# Altium footprint library PcbLib1.PcbLib: 58 footprints (part 1 of 4)
Each footprint in its own frame and in the unit in brackets; x right, y up, seen from the top. Pads: shape width x height; smd on the part's side, far side on the other; paste and mask are expansions set on the pad; w line width, h text height; cw(c..) or ccw(c..) is an arc to the next point about the centre after c.
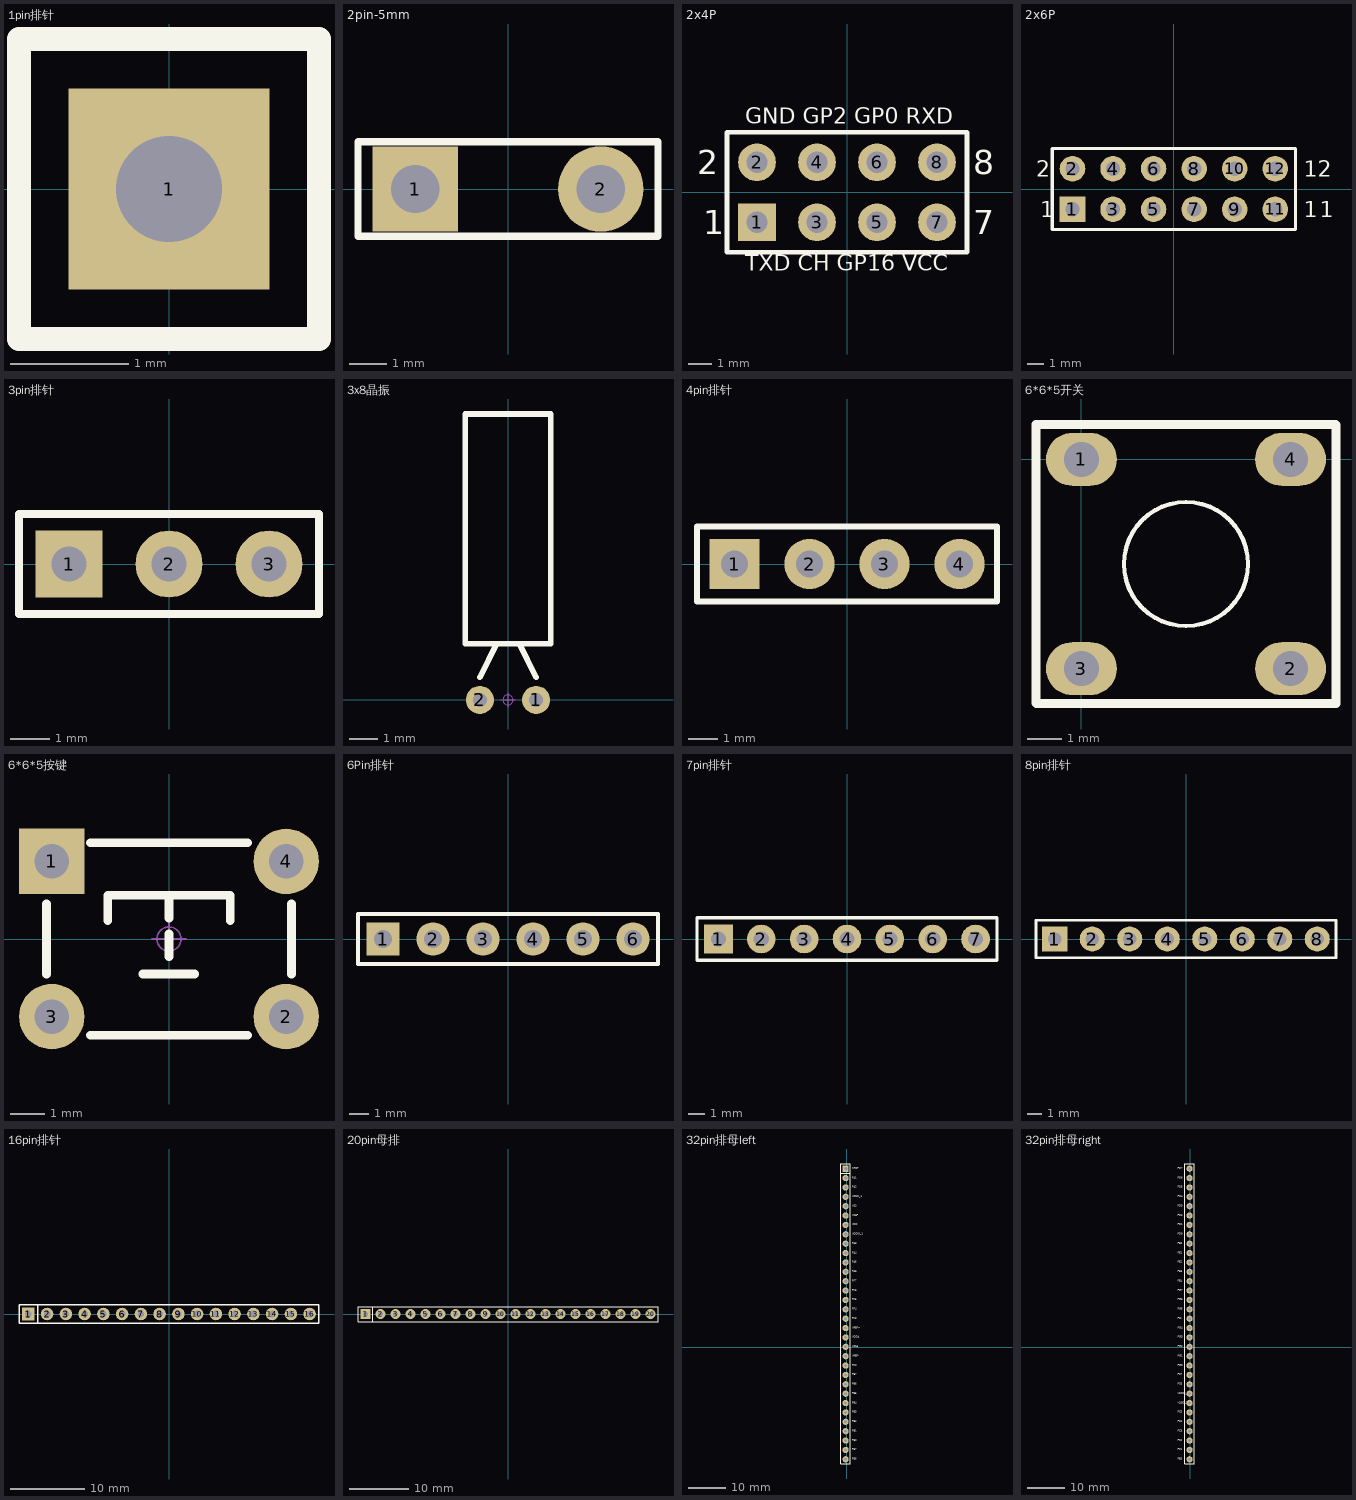
[diagram p0: the footprints below, top view; thin cyan lines are the x and y axes]

## 1pin排针 [mm] "排母，1脚"
pads (1):
  rect 1.7x1.7 hole 0.9: 1(0,0)
Top Overlay:
  lines w0.2: -1.27,-1.27 1.27,-1.27 1.27,1.27 -1.27,1.27 -1.27,-1.27
3D body: height 8.5, standoff -3, extent -1.27,-1.27 1.27,1.27

## 2pin-5mm [mm] "排母，2脚"
pads (2):
  rect 2.3x2.3 hole 1.3: 1(-2.5,0)
  round 2.3 hole 1.3: 2(2.5,0)
Top Overlay:
  lines w0.2: -4.04,-1.27 -4.04,1.27 4.04,1.27 4.04,-1.27 -4.04,-1.27
3D body: height 8.5, standoff -3, extent -3.765,-1.245 -1.225,1.295
3D body: height 8.5, standoff -3, extent 1.225,-1.27 3.765,1.27

## 2x4P [mm] "双排排针，4x2脚"
pads (8):
  rect 1.6x1.6 hole 0.9: 1(-3.81,-1.27)
  round 1.6 hole 0.9: 2(-3.81,1.27) 3(-1.27,-1.27) 4(-1.27,1.27) 5(1.27,-1.27) 6(1.27,1.27) 7(3.81,-1.27) 8(3.81,1.27)
Top Overlay:
  lines w0.2: -2.328,-2.54 5.08,-2.54 5.08,2.54 -5.08,2.54 -5.08,-2.54 2.54,-2.54
  text "7" at 5.334,-1.778 h1.02
  text "2" at -6.35,0.762 h1.02
  text "1" at -6.096,-1.778 h1.02
  text "8" at 5.334,0.762 h1.02
  text "TXD CH GP16 VCC" at -4.318,-3.556 h1.17
  text "GND GP2 GP0 RXD" at -4.318,2.667 h1.17
3D body: height 8.5, standoff -3, extent 0,-2.54 2.54,2.54
3D body: height 8.5, standoff -3, extent 2.54,-2.54 5.08,2.54
3D body: height 8.5, standoff -3, extent -5.08,-2.54 -2.54,2.54
3D body: height 8.5, standoff -3, extent -2.54,-2.54 0,2.54

## 2x6P [mm] "双排排针，6x2脚"
pads (12):
  rect 1.6x1.6 hole 0.9: 1(-6.35,-1.27)
  round 1.6 hole 0.9: 2(-6.35,1.27) 3(-3.81,-1.27) 4(-3.81,1.27) 5(-1.27,-1.27) 6(-1.27,1.27) 7(1.27,-1.27) 8(1.27,1.27) 9(3.81,-1.27) 10(3.81,1.27) 11(6.35,-1.27) 12(6.35,1.27)
Top Overlay:
  lines w0.2: -7.62,-2.54 -7.62,2.54 7.62,2.54 7.62,-2.54 -7.62,-2.54
  text "2" at -8.636,0.762 h1.02
  text "1" at -8.382,-1.778 h1.02
  text "1" at 8.128,-1.778 h1.02
  text "1" at 9.144,-1.778 h1.02
  text "12" at 8.128,0.762 h1.02
3D body: height 8.5, standoff -3, extent 5.08,-2.54 7.62,2.54
3D body: height 8.5, standoff -3, extent -2.54,-2.54 0,2.54
3D body: height 8.5, standoff -3, extent 0,-2.54 2.54,2.54
3D body: height 8.5, standoff -3, extent -7.62,-2.54 -5.08,2.54
3D body: height 8.5, standoff -3, extent -5.08,-2.54 -2.54,2.54
3D body: height 8.5, standoff -3, extent 2.54,-2.54 5.08,2.54

## 3pin排针 [mm] "排针，3脚"
pads (3):
  rect 1.7x1.7 hole 0.9: 1(-2.54,0)
  round 1.7 hole 0.9: 2(0,0) 3(2.54,0)
Top Overlay:
  lines w0.2: -3.81,-1.27 -3.81,1.27 3.81,1.27 3.81,-1.27 -3.81,-1.27
3D body: height 8.5, standoff -3, extent 1.27,-1.27 3.81,1.27
3D body: height 8.5, standoff -3, extent -1.27,-1.27 1.27,1.27
3D body: height 8.5, standoff -3, extent -3.81,-1.27 -1.27,1.27

## 3x8晶振 [mm] "脚距：2mm"
pads (2):
  round 1 hole 0.5: 1(1,0) 2(-1,0)
Top Overlay:
  lines w0.2: -1,0.8 -0.4,2 ; 0.4,2 1,0.8 ; -1.524,2 1.524,2 1.524,10.16 -1.524,10.16 -1.524,2
Mechanical 15:
  circle w0.04: c0,0 r0.18
  lines w0.04: -0.254,0 0.254,0 ; 0,-0.254 0,0.254
3D body: height 3.03, standoff -2.6, extent -1.5,-0.179 1.5,10

## 4pin排针 [mm] "排母，4脚"
pads (4):
  rect 1.7x1.7 hole 0.9: 1(-3.81,0)
  round 1.7 hole 0.9: 2(-1.27,0) 3(1.27,0) 4(3.81,0)
Top Overlay:
  lines w0.2: -5.08,-1.27 -5.08,1.27 5.08,1.27 5.08,-1.27 -5.08,-1.27
3D body: height 8.5, standoff -3, extent -2.54,-1.27 0,1.27
3D body: height 8.5, standoff -3, extent -5.08,-1.27 -2.54,1.27
3D body: height 8.5, standoff -3, extent 2.54,-1.27 5.08,1.27
3D body: height 8.5, standoff -3, extent 0,-1.27 2.54,1.27

## 6*6*5开关 [mm] "单位mm"
pads (4):
  oval 2.032x1.524 hole 1: 1(0,0) 2(6,-6) 3(0,-6) 4(6,0)
Top Overlay:
  circle w0.127: c3,-3 r1.778
  lines w0.254: -1.3,-6.985 -1.285,-7 7.3,-7 7.3,0.985 7.285,1 -1.3,1 -1.3,-6.985

## 6*6*5按键 [mm] "6*6*5mm"
pads (4):
  rect 1.9x1.9 hole 1: 1(-3.4,2.25)
  round 1.9 hole 1: 2(3.4,-2.25) 3(-3.4,-2.25) 4(3.4,2.25)
Top Overlay:
  lines w0.254: -3.556,-1.016 -3.556,1.016 ; -2.286,-2.794 2.286,-2.794 ; -2.286,2.794 2.286,2.794 ; -1.778,0.533 -1.778,1.27 1.778,1.27 1.778,0.533 ; -0.762,-1.016 0.737,-1.016 ; 0,-0.508 0,0.152 ; 0,0.61 0,1.27 ; 3.556,-1.016 3.556,1.016
Mechanical 15:
  circle w0.05: c0,0 r0.35
  lines w0.05: -0.5,0 0.5,0 ; 0,-0.5 0,0.5
3D body: height 4.95, standoff -3.45, extent -4.106,-3 4.106,3

## 6Pin排针 [mm] "排母，6脚"
pads (6):
  rect 1.7x1.7 hole 0.9: 1(-6.35,0)
  round 1.7 hole 0.9: 2(-3.81,0) 3(-1.27,0) 4(1.27,0) 5(3.81,0) 6(6.35,0)
Top Overlay:
  lines w0.2: -7.62,-1.27 7.62,-1.27 7.62,1.27 -7.62,1.27 -7.62,-1.27
3D body: height 8.5, standoff -3, extent -2.54,-1.27 0,1.27
3D body: height 8.5, standoff -3, extent -7.62,-1.27 -5.08,1.27
3D body: height 8.5, standoff -3, extent -5.08,-1.27 -2.54,1.27
3D body: height 8.5, standoff -3, extent 5.08,-1.27 7.62,1.27
3D body: height 8.5, standoff -3, extent 0,-1.27 2.54,1.27
3D body: height 8.5, standoff -3, extent 2.54,-1.27 5.08,1.27

## 7pin排针 [mm] "排针，7脚"
pads (7):
  rect 1.7x1.7 hole 0.9: 1(-7.62,0)
  round 1.7 hole 0.9: 2(-5.08,0) 3(-2.54,0) 4(0,0) 5(2.54,0) 6(5.08,0) 7(7.62,0)
Top Overlay:
  lines w0.2: -8.89,-1.27 -8.89,1.27 8.89,1.27 8.89,-1.27 -8.89,-1.27
3D body: height 8.5, standoff -3, extent -8.89,-1.27 -6.35,1.27
3D body: height 8.5, standoff -3, extent -6.35,-1.27 -3.81,1.27
3D body: height 8.5, standoff -3, extent -3.81,-1.27 -1.27,1.27
3D body: height 8.5, standoff -3, extent -1.27,-1.27 1.27,1.27
3D body: height 8.5, standoff -3, extent 1.27,-1.27 3.81,1.27
3D body: height 8.5, standoff -3, extent 3.81,-1.27 6.35,1.27
3D body: height 8.5, standoff -3, extent 6.35,-1.27 8.89,1.27

## 8pin排针 [mm] "排针，8脚"
pads (8):
  rect 1.7x1.7 hole 0.9: 1(-8.89,0)
  round 1.7 hole 0.9: 2(-6.35,0) 3(-3.81,0) 4(-1.27,0) 5(1.27,0) 6(3.81,0) 7(6.35,0) 8(8.89,0)
Top Overlay:
  lines w0.2: -10.16,-1.27 10.16,-1.27 10.16,1.27 -10.16,1.27 -10.16,-1.27
3D body: height 8.5, standoff -3, extent -10.16,-1.27 -7.62,1.27
3D body: height 8.5, standoff -3, extent -7.62,-1.27 -5.08,1.27
3D body: height 8.5, standoff -3, extent -5.08,-1.27 -2.54,1.27
3D body: height 8.5, standoff -3, extent -2.54,-1.27 0,1.27
3D body: height 8.5, standoff -3, extent 0,-1.27 2.54,1.27
3D body: height 8.5, standoff -3, extent 5.08,-1.27 7.62,1.27
3D body: height 8.5, standoff -3, extent 2.54,-1.27 5.08,1.27
3D body: height 8.5, standoff -3, extent 7.62,-1.27 10.16,1.27

## 16pin排针 [mm] "排母，16脚"
pads (16):
  rect 1.7x1.7 hole 0.9: 1(-19.05,0)
  round 1.7 hole 0.9: 2(-16.51,0) 3(-13.97,0) 4(-11.43,0) 5(-8.89,0) 6(-6.35,0) 7(-3.81,0) 8(-1.27,0) 9(1.27,0) 10(3.81,0) 11(6.35,0) 12(8.89,0) 13(11.43,0) 14(13.97,0) 15(16.51,0) 16(19.05,0)
Top Overlay:
  lines w0.2: -17.8,-1.25 -17.8,1.25 ; -20.32,-1.27 20.32,-1.27 20.32,1.27 -18.415,1.27 -20.32,1.27 -20.32,-1.27
3D body: height 8.5, standoff -3, extent 17.78,-1.27 20.32,1.27
3D body: height 8.5, standoff -3, extent 15.24,-1.27 17.78,1.27
3D body: height 8.5, standoff -3, extent 12.7,-1.27 15.24,1.27
3D body: height 8.5, standoff -3, extent 10.16,-1.27 12.7,1.27
3D body: height 8.5, standoff -3, extent 7.62,-1.27 10.16,1.27
3D body: height 8.5, standoff -3, extent 0,-1.27 2.54,1.27
3D body: height 8.5, standoff -3, extent -2.54,-1.27 0,1.27
3D body: height 8.5, standoff -3, extent -5.08,-1.27 -2.54,1.27
3D body: height 8.5, standoff -3, extent -7.62,-1.27 -5.08,1.27
3D body: height 8.5, standoff -3, extent -10.16,-1.27 -7.62,1.27
3D body: height 8.5, standoff -3, extent -12.7,-1.27 -10.16,1.27
3D body: height 8.5, standoff -3, extent -15.24,-1.27 -12.7,1.27
3D body: height 8.5, standoff -3, extent -17.78,-1.27 -15.24,1.27
3D body: height 8.5, standoff -3, extent -20.32,-1.27 -17.78,1.27
3D body: height 8.5, standoff -3, extent 2.54,-1.27 5.08,1.27
3D body: height 8.5, standoff -3, extent 5.08,-1.27 7.62,1.27

## 20pin母排 [mm] "圆孔排母，20脚"
pads (20):
  rect 1.7x1.7 hole 0.9: 1(-24.13,0)
  round 1.7 hole 0.9: 2(-21.59,0) 3(-19.05,0) 4(-16.51,0) 5(-13.97,0) 6(-11.43,0) 7(-8.89,0) 8(-6.35,0) 9(-3.81,0) 10(-1.27,0) 11(1.27,0) 12(3.81,0) 13(6.35,0) 14(8.89,0) 15(11.43,0) 16(13.97,0)
  round 1.7 hole 0.762: 17(16.51,0) 18(19.05,0) 19(21.59,0) 20(24.13,0)
Top Overlay:
  lines w0.2: -22.88,-1.25 -22.88,1.25 ; -25.4,-1.27 -25.4,1.27 -23.495,1.27 25.4,1.27 25.4,-1.27 -25.4,-1.27
3D body: height 4.31, standoff -3, extent 22.86,-1.27 25.4,1.27
3D body: height 4.31, standoff -3, extent 20.32,-1.27 22.86,1.27
3D body: height 4.31, standoff -3, extent 17.78,-1.27 20.32,1.27
3D body: height 4.31, standoff -3, extent 15.24,-1.27 17.78,1.27
3D body: height 4.31, standoff -3, extent 12.7,-1.27 15.24,1.27
3D body: height 4.31, standoff -3, extent 10.16,-1.27 12.7,1.27
3D body: height 4.31, standoff -3, extent 7.62,-1.27 10.16,1.27
3D body: height 4.31, standoff -3, extent 5.08,-1.27 7.62,1.27
3D body: height 4.31, standoff -3, extent 2.54,-1.27 5.08,1.27
3D body: height 4.31, standoff -3, extent 0,-1.27 2.54,1.27
3D body: height 4.31, standoff -3, extent -2.54,-1.27 0,1.27
3D body: height 4.31, standoff -3, extent -5.08,-1.27 -2.54,1.27
3D body: height 4.31, standoff -3, extent -7.62,-1.27 -5.08,1.27
3D body: height 4.31, standoff -3, extent -10.16,-1.27 -7.62,1.27
3D body: height 4.31, standoff -3, extent -12.7,-1.27 -10.16,1.27
3D body: height 4.31, standoff -3, extent -15.24,-1.27 -12.7,1.27
3D body: height 4.31, standoff -3, extent -17.78,-1.27 -15.24,1.27
3D body: height 4.31, standoff -3, extent -20.32,-1.27 -17.78,1.27
3D body: height 4.31, standoff -3, extent -22.86,-1.27 -20.32,1.27
3D body: height 4.31, standoff -3, extent -25.4,-1.27 -22.86,1.27

## 32pin排母left [mm] "圆孔排母，20脚"
pads (32):
  rect 1.7x1.7 hole 0.9: 1(-0.254,48.387)
  round 1.7 hole 0.9: 2(-0.254,45.847) 3(-0.254,43.307) 4(-0.254,40.767) 5(-0.254,38.227) 6(-0.254,35.687) 7(-0.254,33.147) 8(-0.254,30.607) 9(-0.254,28.067) 10(-0.254,25.527) 11(-0.254,22.987) 12(-0.254,20.447) 13(-0.254,17.907) 14(-0.254,15.367) 15(-0.254,12.827) 16(-0.254,10.287)
  round 1.7 hole 0.762: 17(-0.254,7.747) 18(-0.254,5.207) 19(-0.254,2.667) 20(-0.254,0.127) 21(-0.254,-2.413) 22(-0.254,-4.953) 23(-0.254,-7.493) 24(-0.254,-10.033) 25(-0.254,-12.573) 26(-0.254,-15.113) 27(-0.254,-17.653) 28(-0.254,-20.193) 29(-0.254,-22.733) 30(-0.254,-25.273) 31(-0.254,-27.813) 32(-0.254,-30.353)
Top Overlay:
  lines w0.2: -1.524,-31.623 -1.524,49.657 1.016,49.657 1.016,47.752 1.016,-31.623 ; -1.504,47.137 0.996,47.137
  lines w0.254: -1.524,-31.623 1.016,-31.623
  text "NRST" at 1.524,48.26 h0.25
  text "PA1" at 1.524,45.72 h0.25
  text "PA2" at 1.524,43.18 h0.25
  text "VSSIO_1" at 1.524,40.64 h0.25
  text "VSS" at 1.524,38.1 h0.25
  text "VCAP" at 1.524,35.56 h0.25
  text "VDD" at 1.524,33.02 h0.25
  text "VDDIO_1" at 1.524,30.48 h0.25
  text "PA3" at 1.524,27.94 h0.25
  text "PA4" at 1.524,25.4 h0.25
  text "PA5" at 1.524,22.86 h0.25
  text "PA6" at 1.524,20.32 h0.25
  text "PF7" at 1.524,17.78 h0.25
  text "PF6" at 1.524,15.24 h0.25
  text "PF5" at 1.524,12.7 h0.25
  text "PF4" at 1.524,10.16 h0.25
  text "PF3" at 1.524,7.62 h0.25
  text "VREF+" at 1.524,5.08 h0.25
  text "VDDA" at 1.524,2.54 h0.25
  text "VSSA" at 1.524,0 h0.25
  text "VREF-" at 1.524,-2.54 h0.25
  text "PF0" at 1.524,-5.08 h0.25
  text "PB7" at 1.524,-7.62 h0.25
  text "PB6" at 1.524,-10.16 h0.25
  text "PB5" at 1.524,-12.7 h0.25
  text "PB4" at 1.524,-15.24 h0.25
  text "PB3" at 1.524,-17.78 h0.25
  text "PB2" at 1.524,-20.32 h0.25
  text "PB1" at 1.524,-22.86 h0.25
  text "PB0" at 1.524,-25.4 h0.25
  text "PE7" at 1.524,-27.94 h0.25
  text "PE6" at 1.524,-30.48 h0.25
3D body: height 4.31, standoff -3, extent -1.524,-1.143 1.016,1.397
3D body: height 4.31, standoff -3, extent -1.524,1.397 1.016,3.937
3D body: height 4.31, standoff -3, extent -1.524,3.937 1.016,6.477
3D body: height 4.31, standoff -3, extent -1.524,6.477 1.016,9.017
3D body: height 4.31, standoff -3, extent -1.524,9.017 1.016,11.557
3D body: height 4.31, standoff -3, extent -1.524,11.557 1.016,14.097
3D body: height 4.31, standoff -3, extent -1.524,14.097 1.016,16.637
3D body: height 4.31, standoff -3, extent -1.524,16.637 1.016,19.177
3D body: height 4.31, standoff -3, extent -1.524,19.177 1.016,21.717
3D body: height 4.31, standoff -3, extent -1.524,21.717 1.016,24.257
3D body: height 4.31, standoff -3, extent -1.524,24.257 1.016,26.797
3D body: height 4.31, standoff -3, extent -1.524,26.797 1.016,29.337
3D body: height 4.31, standoff -3, extent -1.524,29.337 1.016,31.877
3D body: height 4.31, standoff -3, extent -1.524,31.877 1.016,34.417
3D body: height 4.31, standoff -3, extent -1.524,34.417 1.016,36.957
3D body: height 4.31, standoff -3, extent -1.524,36.957 1.016,39.497
3D body: height 4.31, standoff -3, extent -1.524,39.497 1.016,42.037
3D body: height 4.31, standoff -3, extent -1.524,42.037 1.016,44.577
3D body: height 4.31, standoff -3, extent -1.524,44.577 1.016,47.117
3D body: height 4.31, standoff -3, extent -1.524,47.117 1.016,49.657
3D body: height 4.31, standoff -3, extent -1.524,-3.683 1.016,-1.143
3D body: height 4.31, standoff -3, extent -1.524,-6.223 1.016,-3.683
3D body: height 4.31, standoff -3, extent -1.524,-8.763 1.016,-6.223
3D body: height 4.31, standoff -3, extent -1.524,-11.303 1.016,-8.763
3D body: height 4.31, standoff -3, extent -1.524,-13.843 1.016,-11.303
3D body: height 4.31, standoff -3, extent -1.524,-16.383 1.016,-13.843
3D body: height 4.31, standoff -3, extent -1.524,-18.923 1.016,-16.383
3D body: height 4.31, standoff -3, extent -1.524,-21.463 1.016,-18.923
3D body: height 4.31, standoff -3, extent -1.524,-24.003 1.016,-21.463
3D body: height 4.31, standoff -3, extent -1.524,-26.543 1.016,-24.003
3D body: height 4.31, standoff -3, extent -1.524,-29.083 1.016,-26.543
3D body: height 4.31, standoff -3, extent -1.524,-31.623 1.016,-29.083

## 32pin排母right [mm] "圆孔排母，20脚"
pads (32):
  round 1.7 hole 0.762: 33(-0.254,-30.353) 34(-0.254,-27.813) 35(-0.254,-25.273) 36(-0.254,-22.733) 37(-0.254,-20.193) 38(-0.254,-17.653) 39(-0.254,-15.113) 40(-0.254,-12.573) 41(-0.254,-10.033) 42(-0.254,-7.493) 43(-0.254,-4.953) 44(-0.254,-2.413) 45(-0.254,0.127) 46(-0.254,2.667) 47(-0.254,5.207) 48(-0.254,7.747)
  round 1.7 hole 0.9: 49(-0.254,10.287) 50(-0.254,12.827) 51(-0.254,15.367) 52(-0.254,17.907) 53(-0.254,20.447) 54(-0.254,22.987) 55(-0.254,25.527) 56(-0.254,28.067) 57(-0.254,30.607) 58(-0.254,33.147) 59(-0.254,35.687) 60(-0.254,38.227) 61(-0.254,40.767) 62(-0.254,43.307) 63(-0.254,45.847) 64(-0.254,48.387)
Top Overlay:
  lines w0.2: -1.524,-31.623 -1.524,49.657 1.016,49.657 1.016,47.752 1.016,-31.623
  lines w0.254: -1.524,-31.623 1.016,-31.623
  text "PD7" at -3.429,48.26 h0.25
  text "PD6" at -3.429,45.72 h0.25
  text "PD5" at -3.429,43.18 h0.25
  text "PD4" at -3.429,40.64 h0.25
  text "PD3" at -3.429,38.1 h0.25
  text "PD2" at -3.429,35.56 h0.25
  text "PD1" at -3.429,33.02 h0.25
  text "PD0" at -3.429,30.48 h0.25
  text "PE0" at -3.429,27.94 h0.25
  text "PE1" at -3.429,25.4 h0.25
  text "PE2" at -3.429,22.86 h0.25
  text "PE3" at -3.429,20.32 h0.25
  text "PE4" at -3.429,17.78 h0.25
  text "PG7" at -3.429,15.24 h0.25
  text "PG6" at -3.429,12.7 h0.25
  text "PG5" at -3.429,10.16 h0.25
  text "PIO" at -3.429,7.62 h0.25
  text "PG4" at -3.429,5.08 h0.25
  text "PG3" at -3.429,2.54 h0.25
  text "PG2" at -3.429,0 h0.25
  text "PG1" at -3.429,-2.54 h0.25
  text "PG0" at -3.429,-5.08 h0.25
  text "PC7" at -3.429,-7.62 h0.25
  text "PC6" at -3.429,-10.16 h0.25
  text "VDDIO_2" at -3.429,-12.7 h0.25
  text "VSSIO_2" at -3.429,-15.24 h0.25
  text "PC5" at -3.429,-17.78 h0.25
  text "PC4" at -3.429,-20.32 h0.25
  text "PC3" at -3.429,-22.86 h0.25
  text "PC2" at -3.429,-25.4 h0.25
  text "PC1" at -3.429,-27.94 h0.25
  text "PE5" at -3.429,-30.48 h0.25
3D body: height 4.31, standoff -3, extent -1.524,-1.143 1.016,1.397
3D body: height 4.31, standoff -3, extent -1.524,1.397 1.016,3.937
3D body: height 4.31, standoff -3, extent -1.524,3.937 1.016,6.477
3D body: height 4.31, standoff -3, extent -1.524,6.477 1.016,9.017
3D body: height 4.31, standoff -3, extent -1.524,9.017 1.016,11.557
3D body: height 4.31, standoff -3, extent -1.524,11.557 1.016,14.097
3D body: height 4.31, standoff -3, extent -1.524,14.097 1.016,16.637
3D body: height 4.31, standoff -3, extent -1.524,16.637 1.016,19.177
3D body: height 4.31, standoff -3, extent -1.524,19.177 1.016,21.717
3D body: height 4.31, standoff -3, extent -1.524,21.717 1.016,24.257
3D body: height 4.31, standoff -3, extent -1.524,24.257 1.016,26.797
3D body: height 4.31, standoff -3, extent -1.524,26.797 1.016,29.337
3D body: height 4.31, standoff -3, extent -1.524,29.337 1.016,31.877
3D body: height 4.31, standoff -3, extent -1.524,31.877 1.016,34.417
3D body: height 4.31, standoff -3, extent -1.524,34.417 1.016,36.957
3D body: height 4.31, standoff -3, extent -1.524,36.957 1.016,39.497
3D body: height 4.31, standoff -3, extent -1.524,39.497 1.016,42.037
3D body: height 4.31, standoff -3, extent -1.524,42.037 1.016,44.577
3D body: height 4.31, standoff -3, extent -1.524,44.577 1.016,47.117
3D body: height 4.31, standoff -3, extent -1.524,47.117 1.016,49.657
3D body: height 4.31, standoff -3, extent -1.524,-3.683 1.016,-1.143
3D body: height 4.31, standoff -3, extent -1.524,-6.223 1.016,-3.683
3D body: height 4.31, standoff -3, extent -1.524,-8.763 1.016,-6.223
3D body: height 4.31, standoff -3, extent -1.524,-11.303 1.016,-8.763
3D body: height 4.31, standoff -3, extent -1.524,-13.843 1.016,-11.303
3D body: height 4.31, standoff -3, extent -1.524,-16.383 1.016,-13.843
3D body: height 4.31, standoff -3, extent -1.524,-18.923 1.016,-16.383
3D body: height 4.31, standoff -3, extent -1.524,-21.463 1.016,-18.923
3D body: height 4.31, standoff -3, extent -1.524,-24.003 1.016,-21.463
3D body: height 4.31, standoff -3, extent -1.524,-26.543 1.016,-24.003
3D body: height 4.31, standoff -3, extent -1.524,-29.083 1.016,-26.543
3D body: height 4.31, standoff -3, extent -1.524,-31.623 1.016,-29.083